# Altium footprint library Generic Footprint.PcbLib: 160 footprints (part 16 of 20)
Each footprint in its own frame and in the unit in brackets; x right, y up, seen from the top. Pads: shape width x height; smd on the part's side, far side on the other; paste and mask are expansions set on the pad; w line width, h text height; cw(c..) or ccw(c..) is an arc to the next point about the centre after c.
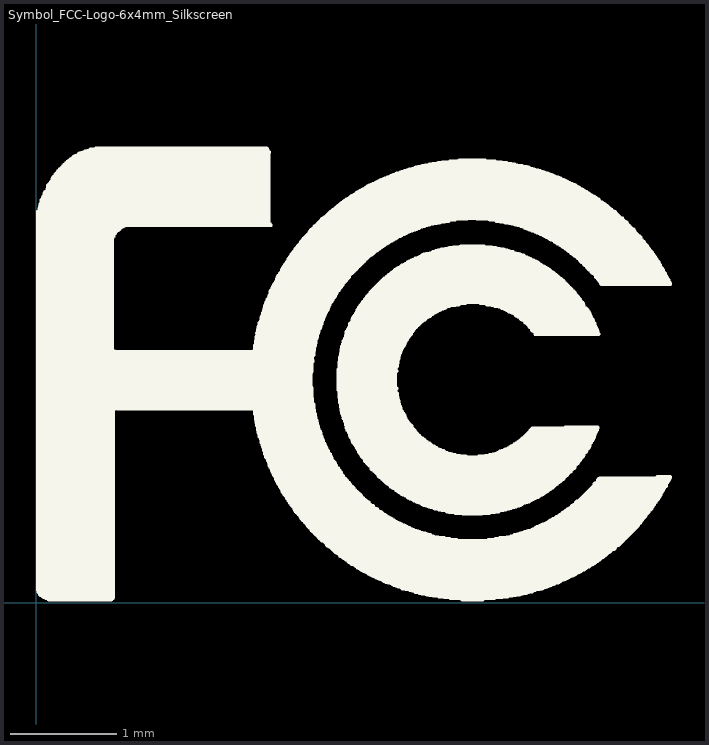
[diagram p15: the footprint, top view; thin cyan lines are the x and y axes]

## Symbol_FCC-Logo-6x4mm_Silkscreen [mil]
pads (8620):
  round 1.57 on Top Overlay: 1(0.68,4.74) 1(0.68,5.01) 1(0.68,5.28) 1(0.68,5.55) 1(0.68,5.81) 1(0.68,6.08) 1(0.68,6.35) 1(0.68,6.62) 1(0.68,6.88) 1(0.68,7.15) 1(0.68,7.42) 1(0.68,7.69) 1(0.68,7.96) 1(0.68,8.22) 1(0.68,8.49) 1(0.68,8.76) 1(0.68,9.03) 1(0.68,9.29) 1(0.68,9.56) 1(0.68,9.83) 1(0.68,10.1) 1(0.68,10.36) 1(0.68,10.63) 1(0.68,10.9) 1(0.68,11.17) 1(0.68,11.44) 1(0.68,11.7) 1(0.68,11.97) 1(0.68,12.24) 1(0.68,12.51) 1(0.68,12.77) 1(0.68,13.04) 1(0.68,13.31) 1(0.68,13.58) 1(0.68,13.85) 1(0.68,14.11) 1(0.68,14.38) 1(0.68,14.65) 1(0.68,14.92) 1(0.68,15.18) 1(0.68,15.45) 1(0.68,15.72) 1(0.68,15.99) 1(0.68,16.25) 1(0.68,16.52) 1(0.68,16.79) 1(0.68,17.06) 1(0.68,17.33) 1(0.68,17.59) 1(0.68,17.86) 1(0.68,18.13) 1(0.68,18.4) 1(0.68,18.66) 1(0.68,18.93) 1(0.68,19.2) 1(0.68,19.47) 1(0.68,19.73) 1(0.68,20) 1(0.68,20.27) 1(0.68,20.54) 1(0.68,20.81) 1(0.68,21.07) 1(0.68,21.34) 1(0.68,21.61) 1(0.68,21.88) 1(0.68,22.14) 1(0.68,22.41) 1(0.68,22.68) 1(0.68,22.95) 1(0.68,23.22) 1(0.68,23.48) 1(0.68,23.75) 1(0.68,24.02) 1(0.68,24.29) 1(0.68,24.55) 1(0.68,24.82) 1(0.68,25.09) 1(0.68,25.36) 1(0.68,25.62) 1(0.68,25.89) 1(0.68,26.16) 1(0.68,26.43) 1(0.68,26.7) 1(0.68,26.96) 1(0.68,27.23) 1(0.68,27.5) 1(0.68,27.77) 1(0.68,28.03) 1(0.68,28.3) 1(0.68,28.57) 1(0.68,28.84) 1(0.68,29.11) 1(0.68,29.37) 1(0.68,29.64) 1(0.68,29.91) 1(0.68,30.18) 1(0.68,30.44) 1(0.68,30.71) 1(0.68,30.98) 1(0.68,31.25) 1(0.68,31.51) 1(0.68,31.78) 1(0.68,32.05) 1(0.68,32.32) 1(0.68,32.59) 1(0.68,32.85) 1(0.68,33.12) 1(0.68,33.39) 1(0.68,33.66) 1(0.68,33.92) 1(0.68,34.19) 1(0.68,34.46) 1(0.68,34.73) 1(0.68,34.99) 1(0.68,35.26) 1(0.68,35.53) 1(0.68,35.8) 1(0.68,36.07) 1(0.68,36.33) 1(0.68,36.6) 1(0.68,36.87) 1(0.68,37.14) 1(0.68,37.4) 1(0.68,37.67) 1(0.68,37.94) 1(0.68,38.21) 1(0.68,38.48) 1(0.68,38.74) 1(0.68,39.01) 1(0.68,39.28) 1(0.68,39.55) 1(0.68,39.81) 1(0.68,40.08) 1(0.68,40.35) 1(0.68,40.62) 1(0.68,40.88) 1(0.68,41.15) 1(0.68,41.42) 1(0.68,41.69) 1(0.68,41.96) 1(0.68,42.22) 1(0.68,42.49) 1(0.68,42.76) 1(0.68,43.03) 1(0.68,43.29) 1(0.68,43.56) 1(0.68,43.83) 1(0.68,44.1) 1(0.68,44.36) 1(0.68,44.63) 1(0.68,44.9) 1(0.68,45.17) 1(0.68,45.44) 1(0.68,45.7) 1(0.68,45.97) 1(0.68,46.24) 1(0.68,46.51) 1(0.68,46.77) 1(0.68,47.04) 1(0.68,47.31) 1(0.68,47.58) 1(0.68,47.85) 1(0.68,48.11) 1(0.68,48.38) 1(0.68,48.65) 1(0.68,48.92) 1(0.68,49.18) 1(0.68,49.45) 1(0.68,49.72) 1(0.68,49.99) 1(0.68,50.25) 1(0.68,50.52) 1(0.68,50.79) 1(0.68,51.06) 1(0.68,51.33) 1(0.68,51.59) 1(0.68,51.86) 1(0.68,52.13) 1(0.68,52.4) 1(0.68,52.66) 1(0.68,52.93) 1(0.68,53.2) 1(0.68,53.47) 1(0.68,53.73) 1(0.68,54) 1(0.68,54.27) 1(0.68,54.54) 1(0.68,54.81) 1(0.68,55.07) 1(0.68,55.34) 1(0.68,55.61) 1(0.68,55.88) 1(0.68,56.14) 1(0.68,56.41) 1(0.68,56.68) 1(0.68,56.95) 1(0.68,57.22) 1(0.68,57.48) 1(0.68,57.75) 1(0.68,58.02) 1(0.68,58.29) 1(0.68,58.55) 1(0.68,58.82) 1(0.68,59.09) 1(0.68,59.36) 1(0.68,59.62) 1(0.68,59.89) 1(0.68,60.16) 1(0.68,60.43) 1(0.68,60.7) 1(0.68,60.96) 1(0.68,61.23) 1(0.68,61.5) 1(0.68,61.77) 1(0.68,62.03) 1(0.68,62.3) 1(0.68,62.57) 1(0.68,62.84) 1(0.68,63.11) 1(0.68,63.37) 1(0.68,63.64) 1(0.68,63.91) 1(0.68,64.18) 1(0.68,64.44) 1(0.68,64.71) 1(0.68,64.98) 1(0.68,65.25) 1(0.68,65.51) 1(0.68,65.78) 1(0.68,66.05) 1(0.68,66.32) 1(0.68,66.59) 1(0.68,66.85) 1(0.68,67.12) 1(0.68,67.39) 1(0.68,67.66) 1(0.68,67.92) 1(0.68,68.19) 1(0.68,68.46) 1(0.68,68.73) 1(0.68,68.99) 1(0.68,69.26) 1(0.68,69.53) 1(0.68,69.8) 1(0.68,70.07) 1(0.68,70.33) 1(0.68,70.6) 1(0.68,70.87) 1(0.68,71.14) 1(0.68,71.4) 1(0.68,71.67) 1(0.68,71.94) 1(0.68,72.21) 1(0.68,72.48) 1(0.68,72.74) 1(0.68,73.01) 1(0.68,73.28) 1(0.68,73.55) 1(0.68,73.81) 1(0.68,74.08) 1(0.68,74.35) 1(0.68,74.62) 1(0.68,74.88) 1(0.68,75.15) 1(0.68,75.42) 1(0.68,75.69) 1(0.68,75.96) 1(0.68,76.22) 1(0.68,76.49) 1(0.68,76.76) 1(0.68,77.03) 1(0.68,77.29) 1(0.68,77.56) 1(0.68,77.83) 1(0.68,78.1) 1(0.68,78.36) 1(0.68,78.63) 1(0.68,78.9) 1(0.68,79.17) 1(0.68,79.44) 1(0.68,79.7) 1(0.68,79.97) 1(0.68,80.24) 1(0.68,80.51) 1(0.68,80.77) 1(0.68,81.04) 1(0.68,81.31) 1(0.68,81.58) 1(0.68,81.85) 1(0.68,82.11) 1(0.68,82.38) 1(0.68,82.65) 1(0.68,82.92) 1(0.68,83.18) 1(0.68,83.45) 1(0.68,83.72) 1(0.68,83.99) 1(0.68,84.25) 1(0.68,84.52) 1(0.68,84.79) 1(0.68,85.06) 1(0.68,85.33) 1(0.68,85.59) 1(0.68,85.86) 1(0.68,86.13) 1(0.68,86.4) 1(0.68,86.66) 1(0.68,86.93) 1(0.68,87.2) 1(0.68,87.47) 1(0.68,87.74) 1(0.68,88) 1(0.68,88.27) 1(0.68,88.54) 1(0.68,88.81) 1(0.68,89.07) 1(0.68,89.34) 1(0.68,89.61) 1(0.68,89.88) 1(0.68,90.14) 1(0.68,90.41) 1(0.68,90.68) 1(0.68,90.95) 1(0.68,91.22) 1(0.68,91.48) 1(0.68,91.75) 1(0.68,92.02) 1(0.68,92.29) 1(0.68,92.55) 1(0.68,92.82) 1(0.68,93.09) 1(0.68,93.36) 1(0.68,93.62) 1(0.68,93.89) 1(0.68,94.16) 1(0.68,94.43) 1(0.68,94.7) 1(0.68,94.96) 1(0.68,95.23) 1(0.68,95.5) 1(0.68,95.77) 1(0.68,96.03) 1(0.68,96.3) 1(0.68,96.57) 1(0.68,96.84) 1(0.68,97.11) 1(0.68,97.37) 1(0.68,97.64) 1(0.68,97.91) 1(0.68,98.18) 1(0.68,98.44) 1(0.68,98.71) 1(0.68,98.98) 1(0.68,99.25) 1(0.68,99.51) 1(0.68,99.78) 1(0.68,100.05) 1(0.68,100.32) 1(0.68,100.59) 1(0.68,100.85) 1(0.68,101.12) 1(0.68,101.39) 1(0.68,101.66) 1(0.68,101.92) 1(0.68,102.19) 1(0.68,102.46) 1(0.68,102.73) 1(0.68,102.99) 1(0.68,103.26) 1(0.68,103.53) 1(0.68,103.8) 1(0.68,104.07) 1(0.68,104.33) 1(0.68,104.6) 1(0.68,104.87) 1(0.68,105.14) 1(0.68,105.4) 1(0.68,105.67) 1(0.68,105.94) 1(0.68,106.21) 1(0.68,106.48) 1(0.68,106.74) 1(0.68,107.01) 1(0.68,107.28) 1(0.68,107.55) 1(0.68,107.81) 1(0.68,108.08) 1(0.68,108.35) 1(0.68,108.62) 1(0.68,108.88) 1(0.68,109.15) 1(0.68,109.42) 1(0.68,109.69) 1(0.68,109.96) 1(0.68,110.22) 1(0.68,110.49) 1(0.68,110.76) 1(0.68,111.03) 1(0.68,111.29) 1(0.68,111.56) 1(0.68,111.83) 1(0.68,112.1) 1(0.68,112.36) 1(0.68,112.63) 1(0.68,112.9) 1(0.68,113.17) 1(0.68,113.44) 1(0.68,113.7) 1(0.68,113.97) 1(0.68,114.24) 1(0.68,114.51) 1(0.68,114.77) 1(0.68,115.04) 1(0.68,115.31) 1(0.68,115.58) 1(0.68,115.85) 1(0.68,116.11) 1(0.68,116.38) 1(0.68,116.65) 1(0.68,116.92) 1(0.68,117.18) 1(0.68,117.45) 1(0.68,117.72) 1(0.68,117.99) 1(0.68,118.25) 1(0.68,118.52) 1(0.68,118.79) 1(0.68,119.06) 1(0.68,119.33) 1(0.68,119.59) 1(0.68,119.86) 1(0.68,120.13) 1(0.68,120.4) 1(0.68,120.66) 1(0.68,120.93) 1(0.68,121.2) 1(0.68,121.47) 1(0.68,121.74) 1(0.68,122) 1(0.68,122.27) 1(0.68,122.54) 1(0.68,122.81) 1(0.68,123.07) 1(0.68,123.34) 1(0.68,123.61) 1(0.68,123.88) 1(0.68,124.14) 1(0.68,124.41) 1(0.68,124.68) 1(0.68,124.95) 1(0.68,125.22) 1(0.68,125.48) 1(0.68,125.75) 1(0.68,126.02) 1(0.68,126.29) 1(0.68,126.55) 1(0.68,126.82) 1(0.68,127.09) 1(0.68,127.36) 1(0.68,127.62) 1(0.68,127.89) 1(0.68,128.16) 1(0.68,128.43) 1(0.68,128.7) 1(0.68,128.96) 1(0.68,129.23) 1(0.68,129.5) 1(0.68,129.77) 1(0.68,130.03) 1(0.68,130.3) 1(0.68,130.57) 1(0.68,130.84) 1(0.68,131.11) 1(0.68,131.37) 1(0.68,131.64) 1(0.68,131.91) 1(0.68,132.18) 1(0.68,132.44) 1(0.68,132.71) 1(0.68,132.98) 1(0.68,133.25) 1(0.68,133.51) 1(0.68,133.78) 1(0.68,134.05) 1(0.68,134.32) 1(0.68,134.59) 1(0.68,134.85) 1(0.68,135.12) 1(0.68,135.39) 1(0.68,135.66) 1(0.68,135.92) 1(0.68,136.19) 1(0.68,136.46) 1(0.68,136.73) 1(0.68,136.99) 1(0.68,137.26) 1(0.68,137.53) 1(0.68,137.8) 1(0.68,138.07) 1(0.68,138.33) 1(0.68,138.6) 1(0.68,138.87) 1(0.68,139.14) 1(0.68,139.4) 1(0.68,139.67) 1(0.68,139.94) 1(0.68,140.21) 1(0.68,140.48) 1(0.68,140.74) 1(0.68,141.01) 1(0.68,141.28) 1(0.68,141.55) 1(0.68,141.81) 1(0.68,142.08) 1(0.68,142.35) 1(0.68,142.62) 1(0.68,142.88) 1(0.68,143.15) 1(0.68,143.42) 1(0.68,143.69) 1(0.68,143.96) 1(0.95,3.94) 1(1.22,4.21) 1(1.22,5.28) 1(1.22,5.55) 1(1.22,5.81) 1(1.22,6.08) 1(1.22,6.35) 1(1.22,6.62) 1(1.22,6.88) 1(1.22,7.15) 1(1.22,7.42) 1(1.22,7.69) 1(1.22,7.96) 1(1.22,8.22) 1(1.22,8.49) 1(1.22,8.76) 1(1.22,9.03) 1(1.22,9.29) 1(1.22,9.56) 1(1.22,9.83) 1(1.22,10.1) 1(1.22,10.36) 1(1.22,10.63) 1(1.22,10.9) 1(1.22,11.17) 1(1.22,11.44) 1(1.22,11.7) 1(1.22,11.97) 1(1.22,12.24) 1(1.22,12.51) 1(1.22,12.77) 1(1.22,13.04) 1(1.22,13.31) 1(1.22,13.58) 1(1.22,13.85) 1(1.22,14.11) 1(1.22,14.38) 1(1.22,14.65) 1(1.22,14.92) 1(1.22,15.18) 1(1.22,15.45) 1(1.22,15.72) 1(1.22,15.99) 1(1.22,16.25) 1(1.22,16.52) 1(1.22,16.79) 1(1.22,17.06) 1(1.22,17.33) 1(1.22,17.59) 1(1.22,17.86) 1(1.22,18.13) 1(1.22,18.4) 1(1.22,18.66) 1(1.22,18.93) 1(1.22,19.2) 1(1.22,19.47) 1(1.22,19.73) 1(1.22,20) 1(1.22,20.27) 1(1.22,20.54) 1(1.22,20.81) 1(1.22,21.07) 1(1.22,21.34) 1(1.22,21.61) 1(1.22,21.88) 1(1.22,22.14) 1(1.22,22.41) 1(1.22,22.68) 1(1.22,22.95) 1(1.22,23.22) 1(1.22,23.48) 1(1.22,23.75) 1(1.22,24.02) 1(1.22,24.29) 1(1.22,24.55) 1(1.22,24.82) 1(1.22,25.09) 1(1.22,25.36) 1(1.22,25.62) 1(1.22,25.89) 1(1.22,26.16) 1(1.22,26.43) 1(1.22,26.7) 1(1.22,26.96) 1(1.22,27.23) 1(1.22,27.5) 1(1.22,27.77) 1(1.22,28.03) 1(1.22,28.3) 1(1.22,28.57) 1(1.22,28.84) 1(1.22,29.11) 1(1.22,29.37) 1(1.22,29.64) 1(1.22,29.91) 1(1.22,30.18) 1(1.22,30.44) 1(1.22,30.71) 1(1.22,30.98) 1(1.22,31.25) 1(1.22,31.51) 1(1.22,31.78) 1(1.22,32.05) 1(1.22,32.32) 1(1.22,32.59) 1(1.22,32.85) 1(1.22,33.12) 1(1.22,33.39) 1(1.22,33.66) 1(1.22,33.92) 1(1.22,34.19) 1(1.22,34.46) 1(1.22,34.73) 1(1.22,34.99) 1(1.22,35.26) 1(1.22,35.53) 1(1.22,35.8) 1(1.22,36.07) 1(1.22,36.33) 1(1.22,36.6) 1(1.22,36.87) 1(1.22,37.14) 1(1.22,37.4) 1(1.22,37.67) 1(1.22,37.94) 1(1.22,38.21) 1(1.22,38.48) 1(1.22,38.74) 1(1.22,39.01) 1(1.22,39.28) 1(1.22,39.55) 1(1.22,39.81) 1(1.22,40.08) 1(1.22,40.35) 1(1.22,40.62) 1(1.22,40.88) 1(1.22,41.15) 1(1.22,41.42) 1(1.22,41.69) 1(1.22,41.96) 1(1.22,42.22) 1(1.22,42.49) 1(1.22,42.76) 1(1.22,43.03) 1(1.22,43.29) 1(1.22,43.56) 1(1.22,43.83) 1(1.22,44.1) 1(1.22,44.36) 1(1.22,44.63) 1(1.22,44.9) 1(1.22,45.17) 1(1.22,45.44) 1(1.22,45.7) 1(1.22,45.97) 1(1.22,46.24) 1(1.22,46.51) 1(1.22,46.77) 1(1.22,47.04) 1(1.22,47.31) 1(1.22,47.58) 1(1.22,47.85) 1(1.22,48.11) 1(1.22,48.38) 1(1.22,48.65) 1(1.22,48.92) 1(1.22,49.18) 1(1.22,49.45) 1(1.22,49.72) 1(1.22,49.99) 1(1.22,50.25) 1(1.22,50.52) 1(1.22,50.79) 1(1.22,51.06) 1(1.22,51.33) 1(1.22,51.59) 1(1.22,51.86) 1(1.22,52.13) 1(1.22,52.4) 1(1.22,52.66) 1(1.22,52.93) 1(1.22,53.2) 1(1.22,53.47) 1(1.22,53.73) 1(1.22,54) 1(1.22,54.27) 1(1.22,54.54) 1(1.22,54.81) 1(1.22,55.07) 1(1.22,55.34) 1(1.22,55.61) 1(1.22,55.88) 1(1.22,56.14) 1(1.22,56.41) 1(1.22,56.68) 1(1.22,56.95) 1(1.22,57.22) 1(1.22,57.48) 1(1.22,57.75) 1(1.22,58.02) 1(1.22,58.29) 1(1.22,58.55) 1(1.22,58.82) 1(1.22,59.09) 1(1.22,59.36) 1(1.22,59.62) 1(1.22,59.89) 1(1.22,60.16) 1(1.22,60.43) 1(1.22,60.7) 1(1.22,60.96) 1(1.22,61.23) 1(1.22,61.5) 1(1.22,61.77) 1(1.22,62.03) 1(1.22,62.3) 1(1.22,62.57) 1(1.22,62.84) 1(1.22,63.11) 1(1.22,63.37) 1(1.22,63.64) 1(1.22,63.91) 1(1.22,64.18) 1(1.22,64.44) 1(1.22,64.71) 1(1.22,64.98) 1(1.22,65.25) 1(1.22,65.51) 1(1.22,65.78) 1(1.22,66.05) 1(1.22,66.32) 1(1.22,66.59) 1(1.22,66.85) 1(1.22,67.12) 1(1.22,67.39) 1(1.22,67.66) 1(1.22,67.92) 1(1.22,68.19) 1(1.22,68.46) 1(1.22,68.73) 1(1.22,68.99) 1(1.22,69.26) 1(1.22,69.53) 1(1.22,69.8) 1(1.22,70.07) 1(1.22,70.33) 1(1.22,70.6) 1(1.22,70.87) 1(1.22,71.14) 1(1.22,71.4) 1(1.22,71.67) 1(1.22,71.94) 1(1.22,72.21) 1(1.22,72.48) 1(1.22,72.74) 1(1.22,73.01) 1(1.22,73.28) 1(1.22,73.55) 1(1.22,73.81) 1(1.22,74.08) 1(1.22,74.35) 1(1.22,74.62) 1(1.22,74.88) 1(1.22,75.15) 1(1.22,75.42) 1(1.22,75.69) 1(1.22,75.96) 1(1.22,76.22) 1(1.22,76.49) 1(1.22,76.76) 1(1.22,77.03) 1(1.22,77.29) 1(1.22,77.56) 1(1.22,77.83) 1(1.22,78.1) 1(1.22,78.36) 1(1.22,78.63) 1(1.22,78.9) 1(1.22,79.17) 1(1.22,79.44) 1(1.22,79.7) 1(1.22,79.97) 1(1.22,80.24) 1(1.22,80.51) 1(1.22,80.77) 1(1.22,81.04) 1(1.22,81.31) 1(1.22,81.58) 1(1.22,81.85) 1(1.22,82.11) 1(1.22,82.38) 1(1.22,82.65) 1(1.22,82.92) 1(1.22,83.18) 1(1.22,83.45) 1(1.22,83.72) 1(1.22,83.99) 1(1.22,84.25) 1(1.22,84.52) 1(1.22,84.79) 1(1.22,85.06) 1(1.22,85.33) 1(1.22,85.59) 1(1.22,85.86) 1(1.22,86.13) 1(1.22,86.4) 1(1.22,86.66) 1(1.22,86.93) 1(1.22,87.2) 1(1.22,87.47) 1(1.22,87.74) 1(1.22,88) 1(1.22,88.27) 1(1.22,88.54) 1(1.22,88.81) 1(1.22,89.07) 1(1.22,89.34) 1(1.22,89.61) 1(1.22,89.88) 1(1.22,90.14) 1(1.22,90.41) 1(1.22,90.68) 1(1.22,90.95) 1(1.22,91.22) 1(1.22,91.48) 1(1.22,91.75) 1(1.22,92.02) 1(1.22,92.29) 1(1.22,92.55) 1(1.22,92.82) 1(1.22,93.09) 1(1.22,93.36) 1(1.22,93.62) 1(1.22,93.89) 1(1.22,94.16) 1(1.22,94.43) 1(1.22,94.7) 1(1.22,94.96) 1(1.22,95.23) 1(1.22,95.5) 1(1.22,95.77) 1(1.22,96.03) 1(1.22,96.3) 1(1.22,96.57) 1(1.22,96.84) 1(1.22,97.11) 1(1.22,97.37) 1(1.22,97.64) 1(1.22,97.91) 1(1.22,98.18) 1(1.22,98.44) 1(1.22,98.71) 1(1.22,98.98) 1(1.22,99.25) 1(1.22,99.51) 1(1.22,99.78) 1(1.22,100.05) 1(1.22,100.32) 1(1.22,100.59) 1(1.22,100.85) 1(1.22,101.12) 1(1.22,101.39) 1(1.22,101.66) 1(1.22,101.92) 1(1.22,102.19) 1(1.22,102.46) 1(1.22,102.73) 1(1.22,102.99) 1(1.22,103.26) 1(1.22,103.53) 1(1.22,103.8) 1(1.22,104.07) 1(1.22,104.33) 1(1.22,104.6) 1(1.22,104.87) 1(1.22,105.14) 1(1.22,105.4) 1(1.22,105.67) 1(1.22,105.94) 1(1.22,106.21) 1(1.22,106.48) 1(1.22,106.74) 1(1.22,107.01) 1(1.22,107.28) 1(1.22,107.55) 1(1.22,107.81) 1(1.22,108.08) 1(1.22,108.35) 1(1.22,108.62) 1(1.22,108.88) 1(1.22,109.15) 1(1.22,109.42) 1(1.22,109.69) 1(1.22,109.96) 1(1.22,110.22) 1(1.22,110.49) 1(1.22,110.76) 1(1.22,111.03) 1(1.22,111.29) 1(1.22,111.56) 1(1.22,111.83) 1(1.22,112.1) 1(1.22,112.36) 1(1.22,112.63) 1(1.22,112.9) 1(1.22,113.17) 1(1.22,113.44) 1(1.22,113.7) 1(1.22,113.97) 1(1.22,114.24) 1(1.22,114.51) 1(1.22,114.77) 1(1.22,115.04) 1(1.22,115.31) 1(1.22,115.58) 1(1.22,115.85) 1(1.22,116.11) 1(1.22,116.38) 1(1.22,116.65) 1(1.22,116.92) 1(1.22,117.18) 1(1.22,117.45) 1(1.22,117.72) 1(1.22,117.99) 1(1.22,118.25) 1(1.22,118.52) 1(1.22,118.79) 1(1.22,119.06) 1(1.22,119.33) 1(1.22,119.59) 1(1.22,119.86) 1(1.22,120.13) 1(1.22,120.4) 1(1.22,120.66) 1(1.22,120.93) 1(1.22,121.2) 1(1.22,121.47) 1(1.22,121.74) 1(1.22,122) 1(1.22,122.27) 1(1.22,122.54) 1(1.22,122.81) 1(1.22,123.07) 1(1.22,123.34) 1(1.22,123.61) 1(1.22,123.88) 1(1.22,124.14) 1(1.22,124.41) 1(1.22,124.68) 1(1.22,124.95) 1(1.22,125.22) 1(1.22,125.48) 1(1.22,125.75) 1(1.22,126.02) 1(1.22,126.29) 1(1.22,126.55) 1(1.22,126.82) 1(1.22,127.09) 1(1.22,127.36) 1(1.22,127.62) 1(1.22,127.89) 1(1.22,128.16) 1(1.22,128.43) 1(1.22,128.7) 1(1.22,128.96) 1(1.22,129.23) 1(1.22,129.5) 1(1.22,129.77) 1(1.22,130.03) 1(1.22,130.3) 1(1.22,130.57) 1(1.22,130.84) 1(1.22,131.11) 1(1.22,131.37) 1(1.22,131.64) 1(1.22,131.91) 1(1.22,132.18) 1(1.22,132.44) 1(1.22,132.71) 1(1.22,132.98) 1(1.22,133.25) 1(1.22,133.51) 1(1.22,133.78) 1(1.22,134.05) 1(1.22,134.32) 1(1.22,134.59) 1(1.22,134.85) 1(1.22,135.12) 1(1.22,135.39) 1(1.22,135.66) 1(1.22,135.92) 1(1.22,136.19) 1(1.22,136.46) 1(1.22,136.73) 1(1.22,136.99) 1(1.22,137.26) 1(1.22,137.53) 1(1.22,137.8) 1(1.22,138.07) 1(1.22,138.33) 1(1.22,138.6) 1(1.22,138.87) 1(1.22,139.14) 1(1.22,139.4) 1(1.22,139.67) 1(1.22,139.94) 1(1.22,140.21) 1(1.22,140.48) 1(1.22,140.74) 1(1.22,141.01) 1(1.22,141.28) 1(1.22,141.55) 1(1.22,141.81) 1(1.22,142.08) 1(1.22,142.35) 1(1.22,142.62) 1(1.22,142.88) 1(1.22,143.15) 1(1.22,143.42) 1(1.22,143.96) 1(1.22,144.22) 1(1.22,144.49) 1(1.22,144.76) 1(1.22,145.03) 1(1.49,3.14) 1(1.49,3.4) 1(1.49,3.94) 1(1.49,4.48) 1(1.49,5.28) 1(1.49,5.55) 1(1.49,5.81) 1(1.49,6.08) 1(1.49,6.35) 1(1.49,6.62) 1(1.49,6.88) 1(1.49,7.15) 1(1.49,7.42) 1(1.49,7.69) 1(1.49,7.96) 1(1.49,8.22) 1(1.49,8.49) 1(1.49,8.76) 1(1.49,9.03) 1(1.49,9.29) 1(1.49,9.56) 1(1.49,9.83) 1(1.49,10.1) 1(1.49,10.36) 1(1.49,10.63) 1(1.49,10.9) 1(1.49,11.17) 1(1.49,11.44) 1(1.49,11.7) 1(1.49,11.97) 1(1.49,12.24) 1(1.49,12.51) 1(1.49,12.77) 1(1.49,13.04) 1(1.49,13.31) 1(1.49,13.58) 1(1.49,13.85) 1(1.49,14.11) 1(1.49,14.38) 1(1.49,14.65) 1(1.49,14.92) 1(1.49,15.18) 1(1.49,15.45) 1(1.49,15.72) 1(1.49,15.99) 1(1.49,16.25) 1(1.49,16.52) 1(1.49,16.79) 1(1.49,17.06) 1(1.49,17.33) 1(1.49,17.59) 1(1.49,17.86) 1(1.49,18.13) 1(1.49,18.4) 1(1.49,18.66) 1(1.49,18.93) 1(1.49,19.2) 1(1.49,19.47) 1(1.49,19.73) 1(1.49,20) 1(1.49,20.27) 1(1.49,20.54) 1(1.49,20.81) 1(1.49,21.07) 1(1.49,21.34) 1(1.49,21.61) 1(1.49,21.88) 1(1.49,22.14) 1(1.49,22.41) 1(1.49,22.68) 1(1.49,22.95) 1(1.49,23.22) 1(1.49,23.48) 1(1.49,23.75) 1(1.49,24.02) 1(1.49,24.29) 1(1.49,24.55) 1(1.49,24.82) 1(1.49,25.09) 1(1.49,25.36) 1(1.49,25.62) 1(1.49,25.89) 1(1.49,26.16) 1(1.49,26.43) 1(1.49,26.7) 1(1.49,26.96) 1(1.49,27.23) 1(1.49,27.5) 1(1.49,27.77) 1(1.49,28.03) 1(1.49,28.3) 1(1.49,28.57) 1(1.49,28.84) 1(1.49,29.11) 1(1.49,29.37) 1(1.49,29.64) 1(1.49,29.91) 1(1.49,30.18) 1(1.49,30.44) 1(1.49,30.71) 1(1.49,30.98) 1(1.49,31.25) 1(1.49,31.51) 1(1.49,31.78) 1(1.49,32.05) 1(1.49,32.32) 1(1.49,32.59) 1(1.49,32.85) 1(1.49,33.12) 1(1.49,33.39) 1(1.49,33.66) 1(1.49,33.92) 1(1.49,34.19) 1(1.49,34.46) 1(1.49,34.73) 1(1.49,34.99) 1(1.49,35.26) 1(1.49,35.53) 1(1.49,35.8) 1(1.49,36.07) 1(1.49,36.33) 1(1.49,36.6) 1(1.49,36.87) 1(1.49,37.14) 1(1.49,37.4) 1(1.49,37.67) 1(1.49,37.94) 1(1.49,38.21) 1(1.49,38.48) 1(1.49,38.74) 1(1.49,39.01) 1(1.49,39.28) 1(1.49,39.55) 1(1.49,39.81) 1(1.49,40.08) 1(1.49,40.35) 1(1.49,40.62) 1(1.49,40.88) 1(1.49,41.15) 1(1.49,41.42) 1(1.49,41.69) 1(1.49,41.96) 1(1.49,42.22) 1(1.49,42.49) 1(1.49,42.76) 1(1.49,43.03) 1(1.49,43.29) 1(1.49,43.56) 1(1.49,43.83) 1(1.49,44.1) 1(1.49,44.36) 1(1.49,44.63) 1(1.49,44.9) 1(1.49,45.17) 1(1.49,45.44) 1(1.49,45.7) 1(1.49,45.97) 1(1.49,46.24) 1(1.49,46.51) 1(1.49,46.77) 1(1.49,47.04) 1(1.49,47.31) 1(1.49,47.58) 1(1.49,47.85) 1(1.49,48.11) 1(1.49,48.38) 1(1.49,48.65) 1(1.49,48.92) 1(1.49,49.18) 1(1.49,49.45) 1(1.49,49.72) 1(1.49,49.99) 1(1.49,50.25) 1(1.49,50.52) 1(1.49,50.79) 1(1.49,51.06) 1(1.49,51.33) 1(1.49,51.59) 1(1.49,51.86) 1(1.49,52.13) 1(1.49,52.4) 1(1.49,52.66) 1(1.49,52.93) 1(1.49,53.2) 1(1.49,53.47) 1(1.49,53.73) 1(1.49,54) 1(1.49,54.27) 1(1.49,54.54) 1(1.49,54.81) 1(1.49,55.07) 1(1.49,55.34) 1(1.49,55.61) 1(1.49,55.88) 1(1.49,56.14) 1(1.49,56.41) 1(1.49,56.68) 1(1.49,56.95) 1(1.49,57.22) 1(1.49,57.48) 1(1.49,57.75) 1(1.49,58.02) 1(1.49,58.29) 1(1.49,58.55) 1(1.49,58.82) 1(1.49,59.09) 1(1.49,59.36) 1(1.49,59.62) 1(1.49,59.89) 1(1.49,60.16) 1(1.49,60.43) 1(1.49,60.7) 1(1.49,60.96) 1(1.49,61.23) 1(1.49,61.5) 1(1.49,61.77) 1(1.49,62.03) 1(1.49,62.3) 1(1.49,62.57) 1(1.49,62.84) 1(1.49,63.11) 1(1.49,63.37) 1(1.49,63.64) 1(1.49,63.91) 1(1.49,64.18) 1(1.49,64.44) 1(1.49,64.71) 1(1.49,64.98) 1(1.49,65.25) 1(1.49,65.51) 1(1.49,65.78) 1(1.49,66.05) 1(1.49,66.32) 1(1.49,66.59) 1(1.49,66.85) 1(1.49,67.12) 1(1.49,67.39) 1(1.49,67.66) 1(1.49,67.92) 1(1.49,68.19) 1(1.49,68.46) 1(1.49,68.73) 1(1.49,68.99) 1(1.49,69.26) 1(1.49,69.53) 1(1.49,69.8) 1(1.49,70.07) 1(1.49,70.33) 1(1.49,70.6) 1(1.49,70.87) 1(1.49,71.14) 1(1.49,71.4) 1(1.49,71.67) 1(1.49,71.94) 1(1.49,72.21) 1(1.49,72.48) 1(1.49,72.74) 1(1.49,73.01) 1(1.49,73.28) 1(1.49,73.55) 1(1.49,73.81) 1(1.49,74.08) 1(1.49,74.35) 1(1.49,74.62) 1(1.49,74.88) 1(1.49,75.15) 1(1.49,75.42) 1(1.49,75.69) 1(1.49,75.96) 1(1.49,76.22) 1(1.49,76.49) 1(1.49,76.76) 1(1.49,77.03) 1(1.49,77.29) 1(1.49,77.56) 1(1.49,77.83) 1(1.49,78.1) 1(1.49,78.36) 1(1.49,78.63) 1(1.49,78.9) 1(1.49,79.17) 1(1.49,79.44) 1(1.49,79.7) 1(1.49,79.97) 1(1.49,80.24) 1(1.49,80.51) 1(1.49,80.77) 1(1.49,81.04) 1(1.49,81.31) 1(1.49,81.58) 1(1.49,81.85) 1(1.49,82.11) 1(1.49,82.38) 1(1.49,82.65) 1(1.49,82.92) 1(1.49,83.18) 1(1.49,83.45) 1(1.49,83.72) 1(1.49,83.99) 1(1.49,84.25) 1(1.49,84.52) 1(1.49,84.79) 1(1.49,85.06) 1(1.49,85.33) 1(1.49,85.59) 1(1.49,85.86) 1(1.49,86.13) 1(1.49,86.4) 1(1.49,86.66) 1(1.49,86.93) 1(1.49,87.2) 1(1.49,87.47) 1(1.49,87.74) 1(1.49,88) 1(1.49,88.27) 1(1.49,88.54) 1(1.49,88.81) 1(1.49,89.07) 1(1.49,89.34) 1(1.49,89.61) 1(1.49,89.88) 1(1.49,90.14) 1(1.49,90.41) 1(1.49,90.68) 1(1.49,90.95) 1(1.49,91.22) 1(1.49,91.48) 1(1.49,91.75) 1(1.49,92.02) 1(1.49,92.29) 1(1.49,92.55) 1(1.49,92.82) 1(1.49,93.09) 1(1.49,93.36) 1(1.49,93.62) 1(1.49,93.89) 1(1.49,94.16) 1(1.49,94.43) 1(1.49,94.7) 1(1.49,94.96) 1(1.49,95.23) 1(1.49,95.5) 1(1.49,95.77) 1(1.49,96.03) 1(1.49,96.3) 1(1.49,96.57) 1(1.49,96.84) 1(1.49,97.11) 1(1.49,97.37) 1(1.49,97.64) 1(1.49,97.91) 1(1.49,98.18) 1(1.49,98.44) 1(1.49,98.71) 1(1.49,98.98) 1(1.49,99.25) 1(1.49,99.51) 1(1.49,99.78) 1(1.49,100.05) 1(1.49,100.32) 1(1.49,100.59) 1(1.49,100.85) 1(1.49,101.12) 1(1.49,101.39) 1(1.49,101.66) 1(1.49,101.92) 1(1.49,102.19) 1(1.49,102.46) 1(1.49,102.73) 1(1.49,102.99) 1(1.49,103.26) 1(1.49,103.53) 